# Altium footprint library 3M THD.PcbLib: 163 footprints (part 11 of 14)
Each footprint in its own frame and in the unit in brackets; x right, y up, seen from the top. Pads: shape width x height; smd on the part's side, far side on the other; paste and mask are expansions set on the pad; w line width, h text height; cw(c..) or ccw(c..) is an arc to the next point about the centre after c.
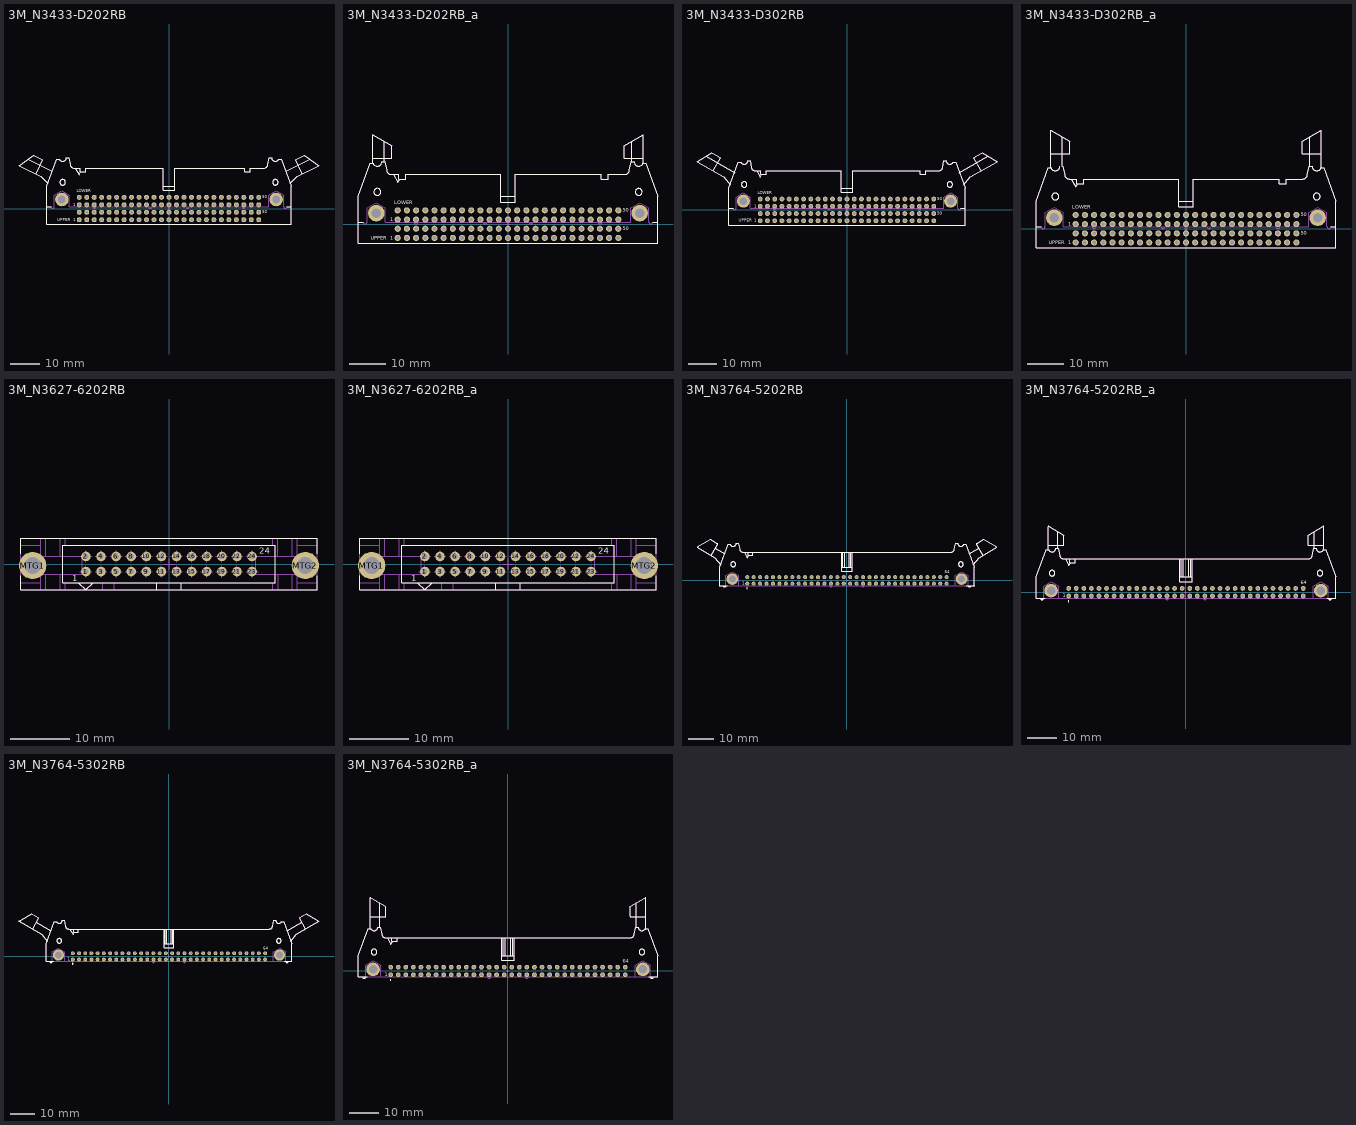
[diagram p10: the footprints below, top view; thin cyan lines are the x and y axes]

## 3M_N3433-D202RB [mm] "3M, 3000 Series, 2x50 Contacts - Pitch 2.54mm - Right Angle Four-Wall Condo Header (Black) With Short Roll Pin Latch/Ejectors"
height 15.5
pads (102):
  round 1.7 hole 1: 1L(-30.48,1.27) 1U(-30.48,-3.81) 2L(-30.48,3.81) 2U(-30.48,-1.27) 3L(-27.94,1.27) 3U(-27.94,-3.81) 4L(-27.94,3.81) 4U(-27.94,-1.27) 5L(-25.4,1.27) 5U(-25.4,-3.81) 6L(-25.4,3.81) 6U(-25.4,-1.27) 7L(-22.86,1.27) 7U(-22.86,-3.81) 8L(-22.86,3.81) 8U(-22.86,-1.27) 9L(-20.32,1.27) 9U(-20.32,-3.81) 10L(-20.32,3.81) 10U(-20.32,-1.27) 11L(-17.78,1.27) 11U(-17.78,-3.81) 12L(-17.78,3.81) 12U(-17.78,-1.27) 13L(-15.24,1.27) 13U(-15.24,-3.81) 14L(-15.24,3.81) 14U(-15.24,-1.27) 15L(-12.7,1.27) 15U(-12.7,-3.81) 16L(-12.7,3.81) 16U(-12.7,-1.27) 17L(-10.16,1.27) 17U(-10.16,-3.81) 18L(-10.16,3.81) 18U(-10.16,-1.27) 19L(-7.62,1.27) 19U(-7.62,-3.81) 20L(-7.62,3.81) 20U(-7.62,-1.27) 21L(-5.08,1.27) 21U(-5.08,-3.81) 22L(-5.08,3.81) 22U(-5.08,-1.27) 23L(-2.54,1.27) 23U(-2.54,-3.81) 24L(-2.54,3.81) 24U(-2.54,-1.27) 25L(0,1.27) 25U(0,-3.81) 26L(0,3.81) 26U(0,-1.27) 27L(2.54,1.27) 27U(2.54,-3.81) 28L(2.54,3.81) 28U(2.54,-1.27) 29L(5.08,1.27) 29U(5.08,-3.81) 30L(5.08,3.81) 30U(5.08,-1.27) 31L(7.62,1.27) 31U(7.62,-3.81) 32L(7.62,3.81) 32U(7.62,-1.27) 33L(10.16,1.27) 33U(10.16,-3.81) 34L(10.16,3.81) 34U(10.16,-1.27) 35L(12.7,1.27) 35U(12.7,-3.81) 36L(12.7,3.81) 36U(12.7,-1.27) 37L(15.24,1.27) 37U(15.24,-3.81) 38L(15.24,3.81) 38U(15.24,-1.27) 39L(17.78,1.27) 39U(17.78,-3.81) 40L(17.78,3.81) 40U(17.78,-1.27) 41L(20.32,1.27) 41U(20.32,-3.81) 42L(20.32,3.81) 42U(20.32,-1.27) 43L(22.86,1.27) 43U(22.86,-3.81) 44L(22.86,3.81) 44U(22.86,-1.27) 45L(25.4,1.27) 45U(25.4,-3.81) 46L(25.4,3.81) 46U(25.4,-1.27) 47L(27.94,1.27) 47U(27.94,-3.81) 48L(27.94,3.81) 48U(27.94,-1.27) 49L(30.48,1.27) 49U(30.48,-3.81) 50L(30.48,3.81) 50U(30.48,-1.27)
  round 4.6 hole 2.6: MTG1(-36.385,3.07) MTG2(36.385,3.07)
Top Overlay:
  circle w0.2: c-36.116,8.915 r0.953
  circle w0.2: c-36.116,8.915 r0.953
  circle w0.2: c36.116,8.915 r0.953
  circle w0.2: c36.116,8.915 r0.953
  circle w0.2: c-36.116,8.915 r0.953
  lines w0.2: -47.871,16.687 -39.607,12.71 ; -45.088,11.768 -42.808,16.505 -45.932,18.009 -50.948,14.588 -43.517,11.011 -41.119,8.554 ; -41.45,0.533 -39.99,0.533 ; -31.766,13.741 -30.496,11.542 -29.96,12.471 ; -2.032,7.645 2.032,7.645 ; 39.607,12.71 47.871,16.687 ; 39.99,0.533 41.45,0.533 ; 41.119,8.554 43.517,11.011 50.948,14.588 45.932,18.009 42.808,16.505 45.088,11.768 ; -41.45,-5.309 41.45,-5.309 41.45,7.645 38.122,16.789 37.28,16.789 cw(c36.116,17.297) 34.846,17.297 34.004,17.297 33.574,14.859 cw(c32.277,15.053) 32.242,13.741 27.677,13.741 27.677,12.471 25.759,12.471 25.759,13.741 2.032,13.741 2.032,6.121 -2.032,6.121 -2.032,13.741 -28.299,13.741 -28.299,12.471 -30.217,12.471 -30.217,13.741 -32.242,13.741 cw(c-32.277,15.053) -33.574,14.859 -34.004,17.297 -34.846,17.297 cw(c-36.116,17.297) -37.28,16.789 -38.122,16.789 -41.45,7.645 -41.45,-5.309
  text "50" at 31.74,-1.651 h1.02
  text "50" at 31.74,3.429 h1.02
  text "1" at -32.512,-4.24 h1.02
  text "UPPER" at -37.99,-4.25 h1
  text "LOWER" at -31.365,5.475 h1
  text "1" at -32.512,0.84 h1.02
Mechanical 8:
  drawing of 410 lines, arcs and shapes, not listed
Mechanical 14:
  circle w0.1: c36.116,8.915 r0.953
  circle w0.1: c-36.116,8.915 r0.953
  circle w0.1: c36.385,3.07 r1.27
  circle w0.1: c-36.385,3.07 r1.27
  lines w0.1: -47.871,16.687 -39.607,12.71 ; -45.088,11.768 -42.808,16.505 -45.932,18.009 -50.948,14.588 -43.517,11.011 -41.119,8.554 ; -41.45,0.533 -39.99,0.533 ccw(c-39.482,0.533) -38.974,0.533 -38.935,0.533 -38.935,4.518 -36.434,5.962 -33.932,4.518 -33.932,0.533 33.932,0.533 33.932,4.518 36.434,5.962 38.935,4.518 38.935,0.533 38.974,0.533 ccw(c39.482,0.533) 39.99,0.533 41.45,0.533 ; -31.766,13.741 -30.496,11.542 -29.96,12.471 ; -25.908,0.533 ccw(c-25.4,0.533) -24.892,0.533 ; -6.858,0.533 ccw(c-6.35,0.533) -5.842,0.533 ; -2.032,7.645 2.032,7.645 ; 5.842,0.533 ccw(c6.35,0.533) 6.858,0.533 ; 24.892,0.533 ccw(c25.4,0.533) 25.908,0.533 ; 39.607,12.71 47.871,16.687 ; 41.119,8.554 43.517,11.011 50.948,14.588 45.932,18.009 42.808,16.505 45.088,11.768 ; -41.45,-5.309 41.45,-5.309 41.45,7.645 38.122,16.789 37.28,16.789 cw(c36.116,17.297) 34.846,17.297 34.004,17.297 33.574,14.859 cw(c32.277,15.053) 32.242,13.741 27.677,13.741 27.677,12.471 25.759,12.471 25.759,13.741 2.032,13.741 2.032,6.121 -2.032,6.121 -2.032,13.741 -28.299,13.741 -28.299,12.471 -30.217,12.471 -30.217,13.741 -32.242,13.741 cw(c-32.277,15.053) -33.574,14.859 -34.004,17.297 -34.846,17.297 cw(c-36.116,17.297) -37.28,16.789 -38.122,16.789 -41.45,7.645 -41.45,-5.309
  text "50" at 31.74,3.429 h1.02
  text "50" at 31.74,-1.651 h1.02
  text "1" at -32.512,-4.24 h1.02
  text "1" at -32.512,-4.24 h1.02
  text "UPPER" at -37.99,-4.25 h1
  text "LOWER" at -31.365,5.475 h1
  text "1" at -32.512,0.84 h1.02
3D body "3M_N3433-D202RB.stp": height 15.49, standoff -3.81, extent -50.846,-5.309 50.846,18.009

## 3M_N3433-D202RB_a [mm] "3M, 3000 Series, 2x50 Contacts - Pitch 2.54mm - Right Angle Four-Wall Condo Header (Black) With Short Roll Pin Latch/Ejectors"
height 15.5
pads (102):
  round 1.7 hole 1: 1L(-30.48,1.27) 1U(-30.48,-3.81) 2L(-30.48,3.81) 2U(-30.48,-1.27) 3L(-27.94,1.27) 3U(-27.94,-3.81) 4L(-27.94,3.81) 4U(-27.94,-1.27) 5L(-25.4,1.27) 5U(-25.4,-3.81) 6L(-25.4,3.81) 6U(-25.4,-1.27) 7L(-22.86,1.27) 7U(-22.86,-3.81) 8L(-22.86,3.81) 8U(-22.86,-1.27) 9L(-20.32,1.27) 9U(-20.32,-3.81) 10L(-20.32,3.81) 10U(-20.32,-1.27) 11L(-17.78,1.27) 11U(-17.78,-3.81) 12L(-17.78,3.81) 12U(-17.78,-1.27) 13L(-15.24,1.27) 13U(-15.24,-3.81) 14L(-15.24,3.81) 14U(-15.24,-1.27) 15L(-12.7,1.27) 15U(-12.7,-3.81) 16L(-12.7,3.81) 16U(-12.7,-1.27) 17L(-10.16,1.27) 17U(-10.16,-3.81) 18L(-10.16,3.81) 18U(-10.16,-1.27) 19L(-7.62,1.27) 19U(-7.62,-3.81) 20L(-7.62,3.81) 20U(-7.62,-1.27) 21L(-5.08,1.27) 21U(-5.08,-3.81) 22L(-5.08,3.81) 22U(-5.08,-1.27) 23L(-2.54,1.27) 23U(-2.54,-3.81) 24L(-2.54,3.81) 24U(-2.54,-1.27) 25L(0,1.27) 25U(0,-3.81) 26L(0,3.81) 26U(0,-1.27) 27L(2.54,1.27) 27U(2.54,-3.81) 28L(2.54,3.81) 28U(2.54,-1.27) 29L(5.08,1.27) 29U(5.08,-3.81) 30L(5.08,3.81) 30U(5.08,-1.27) 31L(7.62,1.27) 31U(7.62,-3.81) 32L(7.62,3.81) 32U(7.62,-1.27) 33L(10.16,1.27) 33U(10.16,-3.81) 34L(10.16,3.81) 34U(10.16,-1.27) 35L(12.7,1.27) 35U(12.7,-3.81) 36L(12.7,3.81) 36U(12.7,-1.27) 37L(15.24,1.27) 37U(15.24,-3.81) 38L(15.24,3.81) 38U(15.24,-1.27) 39L(17.78,1.27) 39U(17.78,-3.81) 40L(17.78,3.81) 40U(17.78,-1.27) 41L(20.32,1.27) 41U(20.32,-3.81) 42L(20.32,3.81) 42U(20.32,-1.27) 43L(22.86,1.27) 43U(22.86,-3.81) 44L(22.86,3.81) 44U(22.86,-1.27) 45L(25.4,1.27) 45U(25.4,-3.81) 46L(25.4,3.81) 46U(25.4,-1.27) 47L(27.94,1.27) 47U(27.94,-3.81) 48L(27.94,3.81) 48U(27.94,-1.27) 49L(30.48,1.27) 49U(30.48,-3.81) 50L(30.48,3.81) 50U(30.48,-1.27)
  round 4.6 hole 2.6: MTG1(-36.385,3.07) MTG2(36.385,3.07)
Top Overlay:
  circle w0.2: c-36.116,8.915 r0.953
  circle w0.2: c36.116,8.915 r0.953
  circle w0.2: c36.116,8.915 r0.953
  circle w0.2: c-36.116,8.915 r0.953
  circle w0.2: c-36.116,8.915 r0.953
  lines w0.2: -41.45,0.533 -39.99,0.533 ; -37.437,16.789 -37.437,24.74 -32.179,21.704 -32.179,18.237 -37.437,18.237 ; -34.211,17.297 -34.211,22.877 ; -31.766,13.741 -30.496,11.542 -29.96,12.471 ; -2.032,7.645 2.032,7.645 ; 34.211,17.297 34.211,22.877 ; 37.437,16.789 37.437,24.74 32.179,21.704 32.179,18.237 37.437,18.237 ; 39.99,0.533 41.45,0.533 ; -41.45,-5.309 -41.45,7.645 -38.122,16.789 -37.28,16.789 ccw(c-36.116,17.297) -34.846,17.297 -34.004,17.297 -33.574,14.859 ccw(c-32.277,15.053) -32.242,13.741 -30.217,13.741 -30.217,12.471 -28.299,12.471 -28.299,13.741 -2.032,13.741 -2.032,6.121 2.032,6.121 2.032,13.741 25.759,13.741 25.759,12.471 27.677,12.471 27.677,13.741 32.242,13.741 ccw(c32.277,15.053) 33.574,14.859 34.004,17.297 34.846,17.297 ccw(c36.116,17.297) 37.28,16.789 38.122,16.789 41.45,7.645 41.45,-5.309 -41.45,-5.309
  text "1" at -32.512,0.84 h1.02
  text "LOWER" at -31.365,5.475 h1
  text "UPPER" at -37.99,-4.25 h1
  text "1" at -32.512,-4.24 h1.02
  text "50" at 31.74,3.429 h1.02
  text "50" at 31.74,-1.651 h1.02
Mechanical 8:
  drawing of 410 lines, arcs and shapes, not listed
Mechanical 14:
  circle w0.1: c-36.385,3.07 r1.27
  circle w0.1: c36.385,3.07 r1.27
  circle w0.1: c-36.116,8.915 r0.953
  circle w0.1: c36.116,8.915 r0.953
  lines w0.1: -41.45,0.533 -39.99,0.533 ccw(c-39.482,0.533) -38.974,0.533 -38.935,0.533 -38.935,4.518 -36.434,5.962 -33.932,4.518 -33.932,0.533 33.932,0.533 33.932,4.518 36.434,5.962 38.935,4.518 38.935,0.533 38.974,0.533 ccw(c39.482,0.533) 39.99,0.533 41.45,0.533 ; -37.437,16.789 -37.437,24.74 -32.179,21.704 -32.179,18.237 -37.437,18.237 ; -34.211,17.297 -34.211,22.877 ; -31.766,13.741 -30.496,11.542 -29.96,12.471 ; -25.908,0.533 ccw(c-25.4,0.533) -24.892,0.533 ; -6.858,0.533 ccw(c-6.35,0.533) -5.842,0.533 ; -2.032,7.645 2.032,7.645 ; 5.842,0.533 ccw(c6.35,0.533) 6.858,0.533 ; 24.892,0.533 ccw(c25.4,0.533) 25.908,0.533 ; 34.211,17.297 34.211,22.877 ; 37.437,16.789 37.437,24.74 32.179,21.704 32.179,18.237 37.437,18.237 ; -41.45,-5.309 -41.45,7.645 -38.122,16.789 -37.28,16.789 ccw(c-36.116,17.297) -34.846,17.297 -34.004,17.297 -33.574,14.859 ccw(c-32.277,15.053) -32.242,13.741 -30.217,13.741 -30.217,12.471 -28.299,12.471 -28.299,13.741 -2.032,13.741 -2.032,6.121 2.032,6.121 2.032,13.741 25.759,13.741 25.759,12.471 27.677,12.471 27.677,13.741 32.242,13.741 ccw(c32.277,15.053) 33.574,14.859 34.004,17.297 34.846,17.297 ccw(c36.116,17.297) 37.28,16.789 38.122,16.789 41.45,7.645 41.45,-5.309 -41.45,-5.309
  text "1" at -32.512,0.84 h1.02
  text "LOWER" at -31.365,5.475 h1
  text "UPPER" at -37.99,-4.25 h1
  text "1" at -32.512,-4.24 h1.02
  text "1" at -32.512,-4.24 h1.02
  text "50" at 31.74,-1.651 h1.02
  text "50" at 31.74,3.429 h1.02
3D body "3M_N3433-D202RB_a.stp": height 15.49, standoff -2.84, extent -41.45,-5.309 41.45,24.667

## 3M_N3433-D302RB [mm] "3M, 3000 Series, 2x50 Contacts - Pitch 2.54mm - Right Angle Four-Wall Condo Header (Black) With Long Roll Pin Latch/Ejectors"
height 15.5
pads (102):
  round 1.7 hole 1: 1L(-30.48,1.27) 1U(-30.48,-3.81) 2L(-30.48,3.81) 2U(-30.48,-1.27) 3L(-27.94,1.27) 3U(-27.94,-3.81) 4L(-27.94,3.81) 4U(-27.94,-1.27) 5L(-25.4,1.27) 5U(-25.4,-3.81) 6L(-25.4,3.81) 6U(-25.4,-1.27) 7L(-22.86,1.27) 7U(-22.86,-3.81) 8L(-22.86,3.81) 8U(-22.86,-1.27) 9L(-20.32,1.27) 9U(-20.32,-3.81) 10L(-20.32,3.81) 10U(-20.32,-1.27) 11L(-17.78,1.27) 11U(-17.78,-3.81) 12L(-17.78,3.81) 12U(-17.78,-1.27) 13L(-15.24,1.27) 13U(-15.24,-3.81) 14L(-15.24,3.81) 14U(-15.24,-1.27) 15L(-12.7,1.27) 15U(-12.7,-3.81) 16L(-12.7,3.81) 16U(-12.7,-1.27) 17L(-10.16,1.27) 17U(-10.16,-3.81) 18L(-10.16,3.81) 18U(-10.16,-1.27) 19L(-7.62,1.27) 19U(-7.62,-3.81) 20L(-7.62,3.81) 20U(-7.62,-1.27) 21L(-5.08,1.27) 21U(-5.08,-3.81) 22L(-5.08,3.81) 22U(-5.08,-1.27) 23L(-2.54,1.27) 23U(-2.54,-3.81) 24L(-2.54,3.81) 24U(-2.54,-1.27) 25L(0,1.27) 25U(0,-3.81) 26L(0,3.81) 26U(0,-1.27) 27L(2.54,1.27) 27U(2.54,-3.81) 28L(2.54,3.81) 28U(2.54,-1.27) 29L(5.08,1.27) 29U(5.08,-3.81) 30L(5.08,3.81) 30U(5.08,-1.27) 31L(7.62,1.27) 31U(7.62,-3.81) 32L(7.62,3.81) 32U(7.62,-1.27) 33L(10.16,1.27) 33U(10.16,-3.81) 34L(10.16,3.81) 34U(10.16,-1.27) 35L(12.7,1.27) 35U(12.7,-3.81) 36L(12.7,3.81) 36U(12.7,-1.27) 37L(15.24,1.27) 37U(15.24,-3.81) 38L(15.24,3.81) 38U(15.24,-1.27) 39L(17.78,1.27) 39U(17.78,-3.81) 40L(17.78,3.81) 40U(17.78,-1.27) 41L(20.32,1.27) 41U(20.32,-3.81) 42L(20.32,3.81) 42U(20.32,-1.27) 43L(22.86,1.27) 43U(22.86,-3.81) 44L(22.86,3.81) 44U(22.86,-1.27) 45L(25.4,1.27) 45U(25.4,-3.81) 46L(25.4,3.81) 46U(25.4,-1.27) 47L(27.94,1.27) 47U(27.94,-3.81) 48L(27.94,3.81) 48U(27.94,-1.27) 49L(30.48,1.27) 49U(30.48,-3.81) 50L(30.48,3.81) 50U(30.48,-1.27)
  round 4.6 hole 2.6: MTG1(-36.385,3.07) MTG2(36.385,3.07)
Top Overlay:
  circle w0.2: c-36.116,8.915 r0.953
  circle w0.2: c-36.116,8.915 r0.953
  circle w0.2: c36.116,8.915 r0.953
  circle w0.2: c36.116,8.915 r0.953
  circle w0.2: c-36.116,8.915 r0.953
  lines w0.2: -49.456,18.815 -39.481,13.056 ; -47.051,13.701 -44.422,18.255 -47.424,19.988 -52.682,16.952 -43.343,11.56 -41.029,8.803 ; -41.45,0.533 -39.99,0.533 ; -31.766,13.741 -30.496,11.542 -29.96,12.471 ; -2.032,7.645 2.032,7.645 ; 39.481,13.056 49.456,18.815 ; 39.989,0.533 41.45,0.533 ; 41.029,8.803 43.343,11.56 52.682,16.952 47.424,19.988 44.422,18.255 47.051,13.701 ; -41.45,-5.309 41.45,-5.309 41.45,7.645 38.122,16.789 37.28,16.789 cw(c36.116,17.297) 34.846,17.297 34.004,17.297 33.574,14.859 cw(c32.277,15.053) 32.242,13.741 27.677,13.741 27.677,12.471 25.759,12.471 25.759,13.741 2.032,13.741 2.032,6.121 -2.032,6.121 -2.032,13.741 -28.299,13.741 -28.299,12.471 -30.217,12.471 -30.217,13.741 -32.242,13.741 cw(c-32.277,15.053) -33.574,14.859 -34.004,17.297 -34.846,17.297 cw(c-36.116,17.297) -37.28,16.789 -38.122,16.789 -41.45,7.645 -41.45,-5.309
  text "1" at -32.512,-4.24 h1.02
  text "UPPER" at -37.99,-4.25 h1
  text "LOWER" at -31.365,5.475 h1
  text "1" at -32.512,0.84 h1.02
  text "50" at 31.74,-1.651 h1.02
  text "50" at 31.74,3.429 h1.02
Mechanical 8:
  drawing of 824 lines, arcs and shapes, not listed
Mechanical 14:
  circle w0.1: c36.116,8.915 r0.953
  circle w0.1: c-36.116,8.915 r0.953
  circle w0.1: c36.385,3.07 r1.27
  circle w0.1: c-36.385,3.07 r1.27
  lines w0.1: -49.456,18.815 -39.481,13.056 ; -47.051,13.701 -44.422,18.255 -47.424,19.988 -52.682,16.952 -43.343,11.56 -41.029,8.803 ; -41.45,0.533 -39.99,0.533 ccw(c-39.482,0.533) -38.974,0.533 -38.936,0.533 -38.936,4.518 -36.434,5.962 -33.932,4.518 -33.932,0.533 33.931,0.533 33.931,4.518 36.433,5.962 38.935,4.518 38.935,0.533 38.973,0.533 ccw(c39.481,0.533) 39.989,0.533 41.45,0.533 ; -31.766,13.741 -30.496,11.542 -29.96,12.471 ; -25.908,0.533 ccw(c-25.4,0.533) -24.892,0.533 ; -6.858,0.533 ccw(c-6.35,0.533) -5.842,0.533 ; -2.032,7.645 2.032,7.645 ; 5.842,0.533 ccw(c6.35,0.533) 6.858,0.533 ; 24.892,0.533 ccw(c25.4,0.533) 25.908,0.533 ; 39.481,13.056 49.456,18.815 ; 41.029,8.803 43.343,11.56 52.682,16.952 47.424,19.988 44.422,18.255 47.051,13.701 ; -41.45,-5.309 41.45,-5.309 41.45,7.645 38.122,16.789 37.28,16.789 cw(c36.116,17.297) 34.846,17.297 34.004,17.297 33.574,14.859 cw(c32.277,15.053) 32.242,13.741 27.677,13.741 27.677,12.471 25.759,12.471 25.759,13.741 2.032,13.741 2.032,6.121 -2.032,6.121 -2.032,13.741 -28.299,13.741 -28.299,12.471 -30.217,12.471 -30.217,13.741 -32.242,13.741 cw(c-32.277,15.053) -33.574,14.859 -34.004,17.297 -34.846,17.297 cw(c-36.116,17.297) -37.28,16.789 -38.122,16.789 -41.45,7.645 -41.45,-5.309
  text "1" at -32.512,-4.24 h1.02
  text "1" at -32.512,-4.24 h1.02
  text "UPPER" at -37.99,-4.25 h1
  text "LOWER" at -31.365,5.475 h1
  text "1" at -32.512,0.84 h1.02
  text "50" at 31.74,3.429 h1.02
  text "50" at 31.74,-1.651 h1.02
3D body "3M_N3433-D302RB.stp": height 15.49, standoff -2.84, extent -52.577,-5.309 52.581,19.988

## 3M_N3433-D302RB_a [mm] "3M, 3000 Series, 2x50 Contacts - Pitch 2.54mm - Right Angle Four-Wall Condo Header (Black) With Long Roll Pin Latch/Ejectors"
height 15.5
pads (102):
  round 1.7 hole 1: 1L(-30.48,1.27) 1U(-30.48,-3.81) 2L(-30.48,3.81) 2U(-30.48,-1.27) 3L(-27.94,1.27) 3U(-27.94,-3.81) 4L(-27.94,3.81) 4U(-27.94,-1.27) 5L(-25.4,1.27) 5U(-25.4,-3.81) 6L(-25.4,3.81) 6U(-25.4,-1.27) 7L(-22.86,1.27) 7U(-22.86,-3.81) 8L(-22.86,3.81) 8U(-22.86,-1.27) 9L(-20.32,1.27) 9U(-20.32,-3.81) 10L(-20.32,3.81) 10U(-20.32,-1.27) 11L(-17.78,1.27) 11U(-17.78,-3.81) 12L(-17.78,3.81) 12U(-17.78,-1.27) 13L(-15.24,1.27) 13U(-15.24,-3.81) 14L(-15.24,3.81) 14U(-15.24,-1.27) 15L(-12.7,1.27) 15U(-12.7,-3.81) 16L(-12.7,3.81) 16U(-12.7,-1.27) 17L(-10.16,1.27) 17U(-10.16,-3.81) 18L(-10.16,3.81) 18U(-10.16,-1.27) 19L(-7.62,1.27) 19U(-7.62,-3.81) 20L(-7.62,3.81) 20U(-7.62,-1.27) 21L(-5.08,1.27) 21U(-5.08,-3.81) 22L(-5.08,3.81) 22U(-5.08,-1.27) 23L(-2.54,1.27) 23U(-2.54,-3.81) 24L(-2.54,3.81) 24U(-2.54,-1.27) 25L(0,1.27) 25U(0,-3.81) 26L(0,3.81) 26U(0,-1.27) 27L(2.54,1.27) 27U(2.54,-3.81) 28L(2.54,3.81) 28U(2.54,-1.27) 29L(5.08,1.27) 29U(5.08,-3.81) 30L(5.08,3.81) 30U(5.08,-1.27) 31L(7.62,1.27) 31U(7.62,-3.81) 32L(7.62,3.81) 32U(7.62,-1.27) 33L(10.16,1.27) 33U(10.16,-3.81) 34L(10.16,3.81) 34U(10.16,-1.27) 35L(12.7,1.27) 35U(12.7,-3.81) 36L(12.7,3.81) 36U(12.7,-1.27) 37L(15.24,1.27) 37U(15.24,-3.81) 38L(15.24,3.81) 38U(15.24,-1.27) 39L(17.78,1.27) 39U(17.78,-3.81) 40L(17.78,3.81) 40U(17.78,-1.27) 41L(20.32,1.27) 41U(20.32,-3.81) 42L(20.32,3.81) 42U(20.32,-1.27) 43L(22.86,1.27) 43U(22.86,-3.81) 44L(22.86,3.81) 44U(22.86,-1.27) 45L(25.4,1.27) 45U(25.4,-3.81) 46L(25.4,3.81) 46U(25.4,-1.27) 47L(27.94,1.27) 47U(27.94,-3.81) 48L(27.94,3.81) 48U(27.94,-1.27) 49L(30.48,1.27) 49U(30.48,-3.81) 50L(30.48,3.81) 50U(30.48,-1.27)
  round 4.6 hole 2.6: MTG1(-36.385,3.07) MTG2(36.385,3.07)
Top Overlay:
  circle w0.2: c-36.116,8.915 r0.953
  circle w0.2: c36.116,8.915 r0.953
  circle w0.2: c36.116,8.915 r0.953
  circle w0.2: c-36.116,8.915 r0.953
  circle w0.2: c-36.116,8.915 r0.953
  lines w0.2: -41.45,0.533 -39.99,0.533 ; -37.437,20.775 -32.179,20.775 -32.179,24.241 -37.437,27.277 -37.437,16.789 -37.437,24.739 ; -34.846,17.297 cw(c-36.116,17.297) -37.28,16.789 -38.122,16.789 -41.45,7.645 -41.45,-5.309 41.45,-5.309 41.45,7.645 38.122,16.789 37.28,16.789 cw(c36.116,17.297) 34.846,17.297 34.004,17.297 33.574,14.859 cw(c32.277,15.053) 32.242,13.741 27.677,13.741 27.677,12.471 25.759,12.471 25.759,13.741 2.032,13.741 2.032,6.121 -2.032,6.121 -2.032,13.741 -28.299,13.741 -28.299,12.471 -30.217,12.471 -30.217,13.741 -32.242,13.741 cw(c-32.277,15.053) -33.574,14.859 -34.004,17.297 ; -34.211,17.297 -34.211,25.415 ; -31.766,13.741 -30.496,11.542 -29.96,12.471 ; -2.032,7.645 2.032,7.645 ; 34.211,17.297 34.211,25.415 ; 37.437,16.789 37.437,27.277 32.179,24.241 32.179,20.775 37.437,20.775 ; 39.989,0.533 41.45,0.533
  text "50" at 31.74,3.429 h1.02
  text "50" at 31.74,-1.651 h1.02
  text "1" at -32.512,0.84 h1.02
  text "LOWER" at -31.365,5.475 h1
  text "UPPER" at -37.99,-4.25 h1
  text "1" at -32.512,-4.24 h1.02
Mechanical 8:
  drawing of 820 lines, arcs and shapes, not listed
Mechanical 14:
  circle w0.1: c-36.385,3.07 r1.27
  circle w0.1: c36.385,3.07 r1.27
  circle w0.1: c-36.116,8.915 r0.953
  circle w0.1: c36.116,8.915 r0.953
  lines w0.1: -41.45,0.533 -39.99,0.533 ccw(c-39.482,0.533) -38.974,0.533 -38.936,0.533 -38.936,4.518 -36.434,5.962 -33.932,4.518 -33.932,0.533 33.931,0.533 33.931,4.518 36.433,5.962 38.935,4.518 38.935,0.533 38.973,0.533 ccw(c39.481,0.533) 39.989,0.533 41.45,0.533 ; -37.437,20.775 -32.179,20.775 -32.179,24.241 -37.437,27.277 -37.437,16.789 -37.437,24.739 ; -34.846,17.297 cw(c-36.116,17.297) -37.28,16.789 -38.122,16.789 -41.45,7.645 -41.45,-5.309 41.45,-5.309 41.45,7.645 38.122,16.789 37.28,16.789 cw(c36.116,17.297) 34.846,17.297 34.004,17.297 33.574,14.859 cw(c32.277,15.053) 32.242,13.741 27.677,13.741 27.677,12.471 25.759,12.471 25.759,13.741 2.032,13.741 2.032,6.121 -2.032,6.121 -2.032,13.741 -28.299,13.741 -28.299,12.471 -30.217,12.471 -30.217,13.741 -32.242,13.741 cw(c-32.277,15.053) -33.574,14.859 -34.004,17.297 ; -34.211,17.297 -34.211,25.415 ; -31.766,13.741 -30.496,11.542 -29.96,12.471 ; -25.908,0.533 ccw(c-25.4,0.533) -24.892,0.533 ; -6.858,0.533 ccw(c-6.35,0.533) -5.842,0.533 ; -2.032,7.645 2.032,7.645 ; 5.842,0.533 ccw(c6.35,0.533) 6.858,0.533 ; 24.892,0.533 ccw(c25.4,0.533) 25.908,0.533 ; 34.211,17.297 34.211,25.415 ; 37.437,16.789 37.437,27.277 32.179,24.241 32.179,20.775 37.437,20.775
  text "50" at 31.74,-1.651 h1.02
  text "50" at 31.74,3.429 h1.02
  text "1" at -32.512,0.84 h1.02
  text "LOWER" at -31.365,5.475 h1
  text "UPPER" at -37.99,-4.25 h1
  text "1" at -32.512,-4.24 h1.02
  text "1" at -32.512,-4.24 h1.02
3D body "3M_N3433-D302RB_a.stp": height 15.49, standoff -2.84, extent -41.45,-5.309 41.45,27.206

## 3M_N3627-6202RB [mm] "3M, 3000 Series, 24 Contacts - Pitch 2.54mm - Straight Four-Wall Header (Black) With Short Roll Pin Latch/Ejectors"
height 24.6
pads (26):
  round 1.6 hole 0.9: 1(-13.97,-1.27) 2(-13.97,1.27) 3(-11.43,-1.27) 4(-11.43,1.27) 5(-8.89,-1.27) 6(-8.89,1.27) 7(-6.35,-1.27) 8(-6.35,1.27) 9(-3.81,-1.27) 10(-3.81,1.27) 11(-1.27,-1.27) 12(-1.27,1.27) 13(1.27,-1.27) 14(1.27,1.27) 15(3.81,-1.27) 16(3.81,1.27) 17(6.35,-1.27) 18(6.35,1.27) 19(8.89,-1.27) 20(8.89,1.27) 21(11.43,-1.27) 22(11.43,1.27) 23(13.97,-1.27) 24(13.97,1.27)
  round 4.6 hole 2.8: MTG1(-22.924,-0.254) MTG2(22.924,-0.254)
Top Overlay:
  lines w0.2: -24.892,-2 -24.892,-4.318 ; -24.892,1.7 -24.892,4.3 ; -2.032,-4.318 -2.032,-3.175 ; 2.032,-4.318 2.032,-3.175 ; 14.732,-4.318 -24.892,-4.318 ; 14.732,4.318 -24.892,4.318 24.892,4.318 ; 24.892,-2 24.892,-4.318 -24.892,-4.318 ; 24.892,1.7 24.892,4.3 ; -17.907,-3.175 -17.907,3.175 17.907,3.175 17.907,-3.175 -17.907,-3.175 ; -15.24,-3.175 -13.97,-4.318 -12.7,-3.175 -15.24,-3.175
  text "24" at 15.205,1.727 h1.02
  text "1" at -16.307,-2.921 h1.02
Mechanical 8:
  lines w0.1: -14.97,-1.27 -13.97,-1.27 ; -14.97,1.27 -13.97,1.27 ; -13.97,-2.27 -13.97,-1.27 ; -13.97,-0.27 -13.97,-1.27 ; -13.97,0.27 -13.97,1.27 ; -13.97,2.27 -13.97,1.27 ; -12.97,-1.27 -13.97,-1.27 ; -12.97,1.27 -13.97,1.27 ; -12.43,-1.27 -11.43,-1.27 ; -12.43,1.27 -11.43,1.27 ; -11.43,-2.27 -11.43,-1.27 ; -11.43,-0.27 -11.43,-1.27 ; -11.43,0.27 -11.43,1.27 ; -11.43,2.27 -11.43,1.27 ; -10.43,-1.27 -11.43,-1.27 ; -10.43,1.27 -11.43,1.27 ; -9.89,-1.27 -8.89,-1.27 ; -9.89,1.27 -8.89,1.27 ; -8.89,-2.27 -8.89,-1.27 ; -8.89,-0.27 -8.89,-1.27 ; -8.89,0.27 -8.89,1.27 ; -8.89,2.27 -8.89,1.27 ; -7.89,-1.27 -8.89,-1.27 ; -7.89,1.27 -8.89,1.27 ; -7.35,-1.27 -6.35,-1.27 ; -7.35,1.27 -6.35,1.27 ; -6.35,-2.27 -6.35,-1.27 ; -6.35,-0.27 -6.35,-1.27 ; -6.35,0.27 -6.35,1.27 ; -6.35,2.27 -6.35,1.27 ; -5.35,-1.27 -6.35,-1.27 ; -5.35,1.27 -6.35,1.27 ; -4.81,-1.27 -3.81,-1.27 ; -4.81,1.27 -3.81,1.27 ; -3.81,-2.27 -3.81,-1.27 ; -3.81,-0.27 -3.81,-1.27 ; -3.81,0.27 -3.81,1.27 ; -3.81,2.27 -3.81,1.27 ; -2.81,-1.27 -3.81,-1.27 ; -2.81,1.27 -3.81,1.27 ; -2.27,-1.27 -1.27,-1.27 ; -2.27,1.27 -1.27,1.27 ; -1.27,-2.27 -1.27,-1.27 ; -1.27,-0.27 -1.27,-1.27 ; -1.27,0.27 -1.27,1.27 ; -1.27,2.27 -1.27,1.27 ; -1,0 0,0 ; -0.27,-1.27 -1.27,-1.27 ; -0.27,1.27 -1.27,1.27 ; 0,-1 0,0 ; 0,1 0,0 ; 0.27,-1.27 1.27,-1.27 ; 0.27,1.27 1.27,1.27 ; 1,0 0,0 ; 1.27,-2.27 1.27,-1.27 ; 1.27,-0.27 1.27,-1.27 ; 1.27,0.27 1.27,1.27 ; 1.27,2.27 1.27,1.27 ; 2.27,-1.27 1.27,-1.27 ; 2.27,1.27 1.27,1.27 ; 2.81,-1.27 3.81,-1.27 ; 2.81,1.27 3.81,1.27 ; 3.81,-2.27 3.81,-1.27 ; 3.81,-0.27 3.81,-1.27 ; 3.81,0.27 3.81,1.27 ; 3.81,2.27 3.81,1.27 ; 4.81,-1.27 3.81,-1.27 ; 4.81,1.27 3.81,1.27 ; 5.35,-1.27 6.35,-1.27 ; 5.35,1.27 6.35,1.27 ; 6.35,-2.27 6.35,-1.27 ; 6.35,-0.27 6.35,-1.27 ; 6.35,0.27 6.35,1.27 ; 6.35,2.27 6.35,1.27 ; 7.35,-1.27 6.35,-1.27 ; 7.35,1.27 6.35,1.27 ; 7.89,-1.27 8.89,-1.27 ; 7.89,1.265 8.89,1.265 ; 8.89,-2.27 8.89,-1.27 ; 8.89,-0.27 8.89,-1.27 ; 8.89,0.27 8.89,1.27 ; 8.89,2.27 8.89,1.27 ; 9.89,-1.27 8.89,-1.27 ; 9.89,1.27 8.89,1.27 ; 10.43,-1.27 11.43,-1.27 ; 10.43,1.27 11.43,1.27 ; 11.43,-2.27 11.43,-1.27 ; 11.43,-0.27 11.43,-1.27 ; 11.43,0.27 11.43,1.27 ; 11.43,2.27 11.43,1.27 ; 12.43,-1.27 11.43,-1.27 ; 12.43,1.27 11.43,1.27 ; 12.97,-1.27 13.97,-1.27 ; 12.97,1.265 13.97,1.265 ; 13.97,-2.27 13.97,-1.27 ; 13.97,-0.27 13.97,-1.27 ; 13.97,0.27 13.97,1.27 ; 13.97,2.27 13.97,1.27 ; 14.97,-1.27 13.97,-1.27 ; 14.97,1.27 13.97,1.27